# Altium footprint library 3D_MIG_Controller.PCBLIB: 560 footprints (part 5 of 35)
Each footprint in its own frame and in the unit in brackets; x right, y up, seen from the top. Pads: shape width x height; smd on the part's side, far side on the other; paste and mask are expansions set on the pad; w line width, h text height; cw(c..) or ccw(c..) is an arc to the next point about the centre after c.
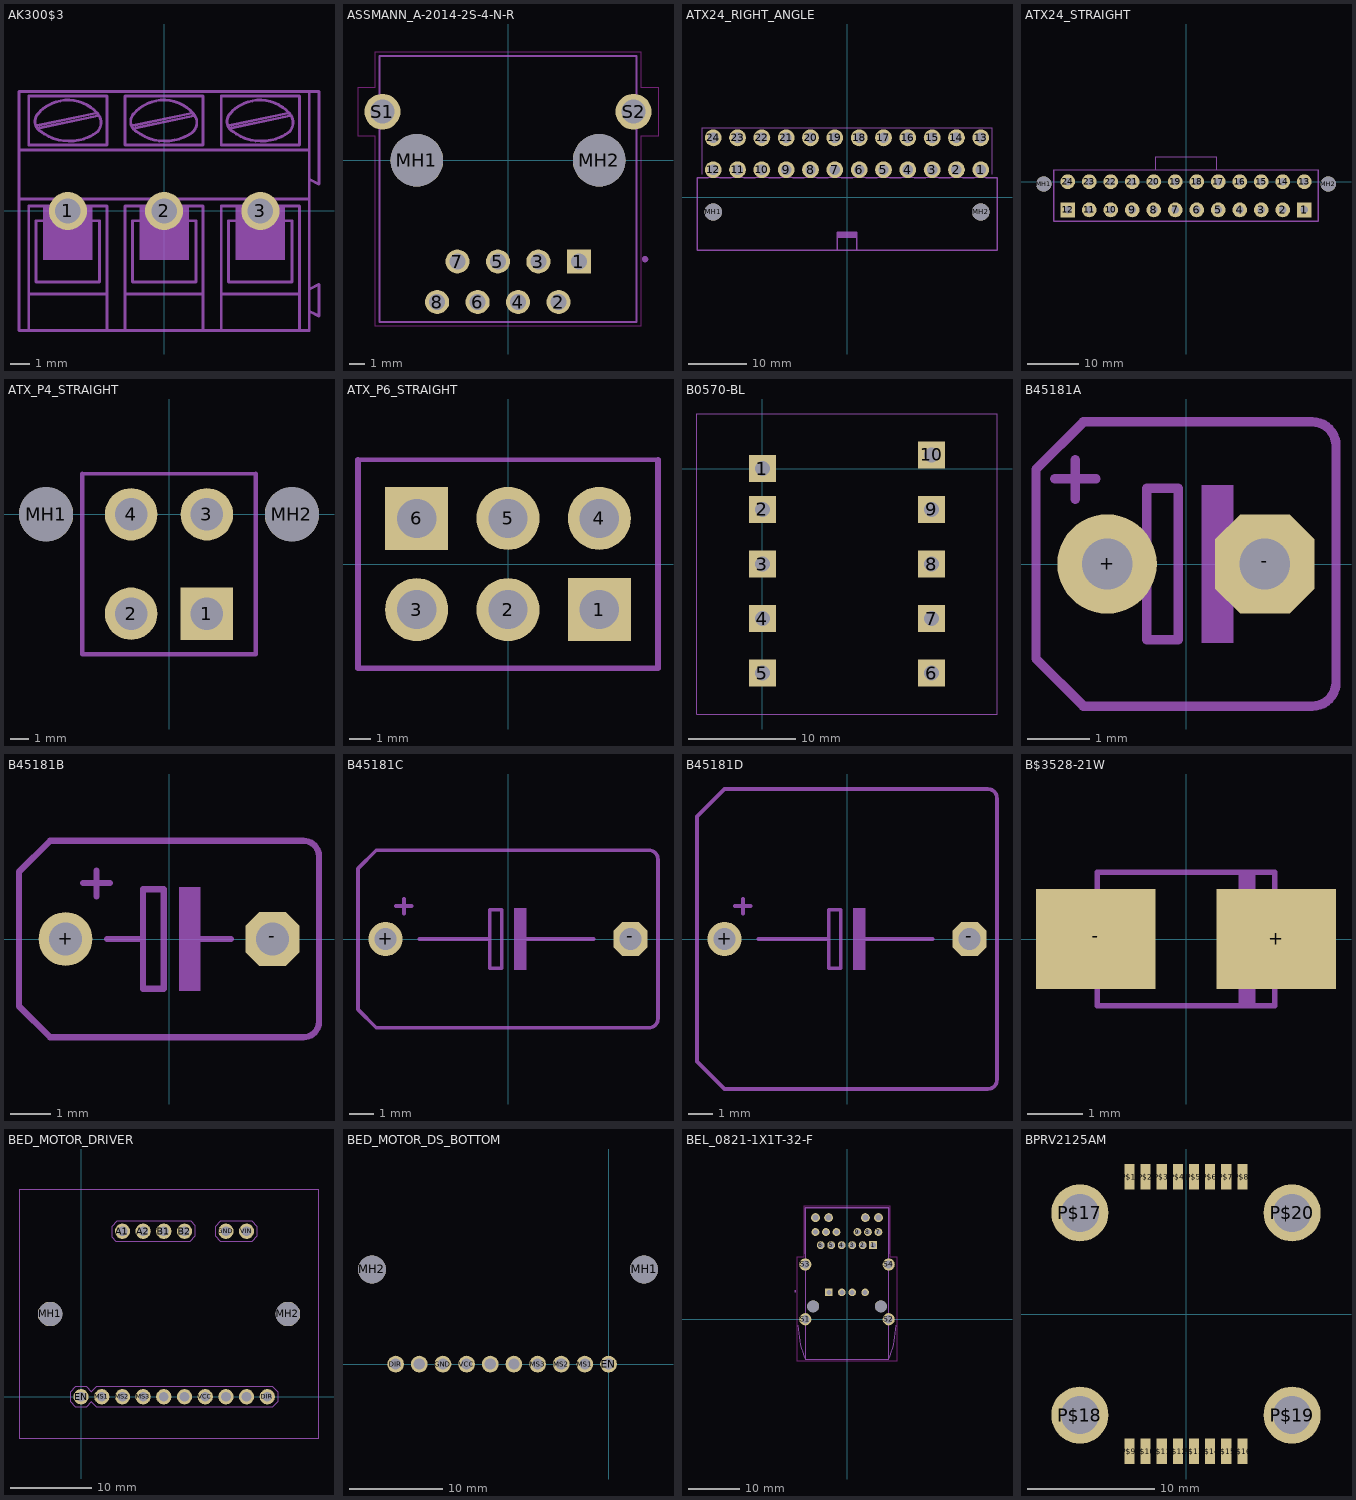
[diagram p4: the footprints below, top view; thin cyan lines are the x and y axes]

## AK300$3 [mil]
pads (3):
  round 78 hole 52: 1(-197,0) 2(0,0) 3(197,0)
tDocu:
  region: -247,-100 -247,10 -147,10 -147,-100
  region: -50,-100 -50,10 50,10 50,-100
  region: 147,-100 147,10 247,10 247,-100
  lines w6: -262,-20 -247,-20 ; -262,10 -132,10 ; -262,25 -132,25 ; -147,-20 -132,-20 ; -65,-20 -50,-20 ; -65,10 65,10 ; -65,25 65,25 ; 50,-20 65,-20 ; 132,-20 146,-20 ; 133,10 262,10 ; 133,25 262,25 ; 247,-20 262,-20
tPlace:
  lines w6: -262,-20 -262,-145 -132,-145 -132,-20 ; -262,10 -277,10 -277,-170 ; -262,25 -297,25 ; -260,175 -140,200 ; -260,197 cw(c-196.99,146) -135.81,199.17 ; -258,199 ccw(c-241,183) -252.34,162.59 ; -255,170 -135,195 ; -254,164 ccw(c-194,239) -136.37,162.16 ; -138.2,160.82 ccw(c-156,181) -136,199 ; -132,10 -117,10 -117,-170 ; -132,25 -65,25 ; -65,-20 -65,-145 65,-145 65,-20 ; -65,10 -80,10 -80,-170 ; -64,175 56,200 ; -64,197 cw(c-0.99,146) 60.19,199.17 ; -62,199 ccw(c-45,183) -56.34,162.59 ; -59,170 61,195 ; -58,164 ccw(c2,239) 59.63,162.16 ; 57.8,160.82 ccw(c40,181) 60,199 ; 65,10 80,10 80,-170 ; 66,25 132,25 ; 132,-20 132,-145 262,-145 262,-20 ; 133,10 117,10 117,-170 ; 133,175 253,200 ; 133,197 cw(c196,146) 257.18,199.16 ; 135,199 ccw(c152,183) 140.66,162.59 ; 138,170 258,195 ; 139,164 ccw(c199,239) 256.63,162.16 ; 254.8,160.82 ccw(c237,181) 257,199 ; 262,10 277,10 277,-170 ; 262,25 297,25 ; -297,25 -297,-245 -277,-245 ; -297,25 -297,125 ; -297,125 297,125 ; -297,125 -297,245 297,245 ; -277,-245 -117,-245 ; -277,-245 -277,-170 ; -277,-170 -117,-170 ; -117,-245 -117,-170 ; -117,-245 -80,-245 ; -80,-245 -80,-170 ; -80,-245 80,-245 ; -80,-170 80,-170 ; 80,-245 117,-245 ; 80,-245 80,-170 ; 117,-245 117,-170 ; 117,-245 277,-245 ; 117,-170 277,-170 ; 277,-245 297,-245 297,-205 ; 277,-245 277,-170 ; 297,-205 317,-215 317,-150 297,-160 ; 297,-205 297,-160 ; 297,-160 297,25 ; 297,25 297,65 ; 297,65 317,55 317,245 297,245 ; 297,65 297,125 ; 297,125 297,245 ; -277,135 -117,135 -117,235 -277,235 -277,135 ; -80,135 -80,235 80,235 80,135 -80,135 ; 117,135 117,235 277,235 277,135 117,135
  text "1" at -275,50 h62
  text "2" at -75,50 h62
  text "3" at 125,50 h62

## ASSMANN_A-2014-2S-4-N-R [mm]
pads (12):
  rect 1.508x1.508 / inner round 1.393 / far side rect 1.508x1.508 hole 1: 1(4.445,-6.35)
  round 1.508 hole 1: 2(3.175,-8.89) 3(1.905,-6.35) 4(0.635,-8.89) 5(-0.635,-6.35) 6(-1.905,-8.89) 7(-3.175,-6.35) 8(-4.445,-8.89)
  round 3.3 hole 3.3 unplated: MH1(-5.715,0) MH2(5.715,0)
  round 2.25 hole 1.5: S1(-7.875,3.05) S2(7.875,3.05)
Top keep-out:
  lines w0.05: -9.41,1.52 -8.325,1.52 -8.325,-10.4 8.325,-10.4 8.325,1.52 9.41,1.52 9.41,4.58 8.325,4.58 8.325,6.8 -8.325,6.8 -8.325,4.58 -9.41,4.58 -9.41,1.52
tDocu:
  circle w0.2: c8.6,-6.2 r0.1
  lines w0.127: -8.075,-10.15 8.075,-10.15 8.075,6.55 -8.075,6.55 -8.075,-10.15
tPlace:
  circle w0.2: c8.6,-6.2 r0.1
  lines w0.127: -8.075,1.35 -8.075,-10.15 8.075,-10.15 8.075,1.35 ; -8.075,4.7 -8.075,6.55 8.075,6.55 8.075,4.7

## ATX24_RIGHT_ANGLE [mm]
pads (26):
  round 2.9 hole 1.8: 1(23.1,4.76) 2(18.9,4.76) 3(14.7,4.76) 4(10.5,4.76) 5(6.3,4.76) 6(2.1,4.76) 7(-2.1,4.76) 8(-6.3,4.76) 9(-10.5,4.76) 10(-14.7,4.76) 11(-18.9,4.76) 12(-23.1,4.76) 13(23.1,10.26) 14(18.9,10.26) 15(14.7,10.26) 16(10.5,10.26) 17(6.3,10.26) 18(2.1,10.26) 19(-2.1,10.26) 20(-6.3,10.26) 21(-10.5,10.26) 22(-14.7,10.26) 23(-18.9,10.26) 24(-23.1,10.26)
  round 3 hole 3 unplated: MH1(-23.1,-2.54) MH2(23.1,-2.54)
tDocu:
  lines w0.127: -25,4 -25,12 25,12 25,4
  lines w0.203: -25.9,3.4 25.9,3.4
tPlace:
  region: -1.7,-7 1.7,-7 1.7,-6 -1.7,-6
  lines w0.254: -24,3.4 -25.9,3.4 -25.9,-9.14 25.9,-9.14 25.9,3.4 24,3.4 ; -22,3.4 -20,3.4 ; -17.8,3.4 -15.8,3.4 ; -13.5,3.4 -11.5,3.4 ; -9.4,3.4 -7.4,3.4 ; -5.2,3.4 -3.2,3.4 ; -1.7,-9 -1.7,-6 1.7,-6 1.7,-9 ; -1,3.4 1,3.4 ; 3.2,3.4 5.2,3.4 ; 7.4,3.4 9.4,3.4 ; 11.6,3.4 13.6,3.4 ; 15.8,3.4 17.8,3.4 ; 20,3.4 22,3.4

## ATX24_STRAIGHT [mm]
pads (26):
  rect 2.9x2.9 / inner round 2.679 / far side rect 2.9x2.9 hole 1.5: 1(23.1,-5.5) 12(-23.1,-5.5)
  round 2.9 hole 1.5: 2(18.9,-5.5) 3(14.7,-5.5) 4(10.5,-5.5) 5(6.3,-5.5) 6(2.1,-5.5) 7(-2.1,-5.5) 8(-6.3,-5.5) 9(-10.5,-5.5) 10(-14.7,-5.5) 11(-18.9,-5.5) 13(23.1,0) 14(18.9,0) 15(14.7,0) 16(10.5,0) 17(6.3,0) 18(2.1,0) 19(-2.1,0) 20(-6.3,0) 21(-10.5,0) 22(-14.7,0) 23(-18.9,0) 24(-23.1,0)
  round 3 hole 3 unplated: MH1(-27.8,-0.46) MH2(27.8,-0.46)
tDocu:
  lines w0.203: -25.9,2.25 25.9,2.25
tPlace:
  lines w0.127: -5.95,2.25 -5.95,4.9 5.95,4.9 5.95,2.25
  lines w0.254: -25.8,2.25 -25.8,-7.75 25.8,-7.75 25.8,2.25

## ATX_P4_STRAIGHT [mm]
pads (6):
  rect 2.9x2.9 / inner round 2.679 / far side rect 2.9x2.9 hole 1.8: 1(2.1,-5.5)
  round 2.9 hole 1.8: 2(-2.1,-5.5) 3(2.1,0) 4(-2.1,0)
  round 3 hole 3 unplated: MH1(-6.8,0) MH2(6.8,0)
tDocu:
  lines w0.203: -4.8,2.25 4.8,2.25
tPlace:
  lines w0.254: -4.8,2.25 -4.8,-7.75 4.8,-7.75 4.8,2.25

## ATX_P6_STRAIGHT [mil]
pads (6):
  rect 114.17x114.17 / inner round 105.48 / far side rect 114.17x114.17 hole 70.87: 1(165.35,-82.68) 6(-165.35,82.68)
  round 114.17 hole 70.87: 2(0,-82.68) 3(-165.35,-82.68) 4(165.35,82.68) 5(0,82.68)
tDocu:
  lines w8: -271.65,188.98 271.65,188.98
tPlace:
  lines w10: -271.65,188.98 -271.65,-188.98 271.65,-188.98 271.65,188.98

## B0570-BL [mil]
pads (10):
  rect 100x100 / inner round 92.39 / far side rect 100x100 hole 53.94: 1(0,0) 2(0,-150) 3(0,-350) 4(0,-550) 5(0,-750) 6(620.08,-750) 7(620.08,-550) 8(620.08,-350) 9(620.08,-150) 10(620.08,50)
tPlace:
  lines w3.94: -240,-900 860,-900 860,200 -240,200 -240,-900

## B45181A [mil]
pads (2):
  round 63 hole 32: +(-50,0)
  oct 63x63 / inner round 58.2 / far side oct 63x63 hole 32: -(50,0)
tDocu:
  region: 10,-50 10,50 30,50 30,-50
  lines w6: -65,0 -25,0 ; 25,0 65,0 ; -25,0 -25,-48 -5,-48 -5,48 -25,48 -25,0
tPlace:
  lines w6: -83,54 -57,54 ; -70,41 -70,66 ; -95,-60 -65,-90 80,-90 ccw(c80,-75) 95,-75 95,75 ccw(c80,75) 80,90 -65,90 -95,60 -95,-60

## B45181B [mil]
pads (2):
  round 52 hole 32: +(-100,0)
  oct 52x52 / inner round 48.04 / far side oct 52x52 hole 32: -(100,0)
tPlace:
  region: 10,-50 10,50 30,50 30,-50
  lines w6: -83,54 -57,54 ; -70,41 -70,66 ; -60,0 -25,0 ; 25,0 60,0 ; -25,0 -25,-48 -5,-48 -5,48 -25,48 -25,0 ; -145,-65 -115,-95 130,-95 ccw(c130,-80) 145,-80 145,80 ccw(c130,80) 130,95 -115,95 -145,65 -145,-65

## B45181C [mil]
pads (2):
  round 56 hole 36: +(-200,0)
  oct 56x56 / inner round 51.74 / far side oct 56x56 hole 36: -(200,0)
tPlace:
  region: 10,-50 10,50 30,50 30,-50
  lines w6: -183,54 -157,54 ; -170,41 -170,66 ; -145,0 -30,0 ; 25,0 140,0 ; -30,0 -30,-48 -10,-48 -10,48 -30,48 -30,0 ; -245,-115 -215,-145 230,-145 ccw(c230,-130) 245,-130 245,130 ccw(c230,130) 230,145 -215,145 -245,115 -245,-115

## B45181D [mil]
pads (2):
  round 56 hole 36: +(-200,0)
  oct 56x56 / inner round 51.74 / far side oct 56x56 hole 36: -(200,0)
tPlace:
  region: 10,-50 10,50 30,50 30,-50
  lines w6: -183,54 -157,54 ; -170,41 -170,66 ; -145,0 -30,0 ; 25,0 140,0 ; -30,0 -30,-48 -10,-48 -10,48 -30,48 -30,0 ; -245,-200 -200,-245 230,-245 ccw(c230,-230) 245,-230 245,230 ccw(c230,230) 230,245 -200,245 -245,200 -245,-200

## B$3528-21W [mil]
pads (2):
  rect 84.65x70.87 smd: +(63.98,0) -(-63.98,0)
tDocu:
  region: -68.9,-23.62 -68.9,23.62 -63.98,23.62 -63.98,-23.62
  region: 63.98,-23.62 63.98,23.62 68.9,23.62 68.9,-23.62
  region: 37.4,-48.23 37.4,48.23 49.21,48.23 49.21,-48.23
  lines w4: -62.99,-47.24 62.99,-47.24 62.99,47.24 -62.99,47.24 -62.99,-47.24

## BED_MOTOR_DRIVER [mil]
pads (18):
  round 74 hole 47.24: A1(200,800) A2(300,800) B1(400,800) B2(500,800) DIR(900,0) EN(0,0) GND(700,800) GND0(700,0) MS1(100,0) MS2(200,0) MS3(300,0) RESET(400,0) SLEEP(500,0) STEP(800,0) VCC(600,0) VIN(800,800)
  round 118.11 hole 118.11 unplated: MH1(-150,400) MH2(1000,400)
tPlace:
  lines w5: -300,-200 -300,1000 1150,1000 1150,-200 -300,-200 ; -50,-25 -25,-50 25,-50 50,-25 75,-50 925,-50 950,-25 950,25 925,50 75,50 50,25 25,50 -25,50 -50,25 -50,-25 ; 150,770 150,825 175,850 530,850 550,830 550,775 525,750 170,750 150,770 ; 650,775 675,750 825,750 850,775 850,825 825,850 675,850 650,825 650,775

## BED_MOTOR_DS_BOTTOM [mm]
pads (12):
  round 1.8 hole 1.2: DIR(-22.86,0) EN(0,0) GND(-17.78,0) MS1(-2.54,0) MS2(-5.08,0) MS3(-7.62,0) RESET(-10.16,0) SLEEP(-12.7,0) STEP(-20.32,0) VCC(-15.24,0)
  round 3 hole 3 unplated: MH1(3.81,10.16) MH2(-25.4,10.16)

## BEL_0821-1X1T-32-F [mil]
pads (26):
  rect 60x60 / inner round 55.43 / far side rect 60x60 hole 40: 1(199.5,565)
  round 60 hole 40: 2(119.5,565) 3(39.5,565) 4(-40.5,565) 5(-120.5,565) 6(-200.5,565) 7(239.5,665) 8(159.5,665) 9(79.5,665) 10(-80.5,665) 11(-160.5,665) 12(-240.5,665)
  round 67.5 hole 45: 13(240,775) 14(140,775) 15(-140,775) 16(-240,775)
  round 91 hole 91 unplated: MH1(-258.5,99) MH2(258.5,99)
  round 93 hole 62: S1(-317.5,0) S2(317.5,0) S3(-317.5,418) S4(317.5,418)
  rect 58x58 / inner round 53.59 / far side rect 58x58 hole 38: U1(-138,205)
  round 58 hole 38: U2(-39.5,205) U3(39.5,205) U4(138,205)
Top keep-out:
  lines w1.97: -384.02,-314.84 384.02,-314.84 384.02,474.41 328.84,474.41 328.84,859.84 -328.84,859.84 -328.84,474.41 -384.02,474.41 -384.02,-314.84
tDocu:
  circle w7.87: c-394.38,212.6 r3.94
  lines w5: -374,-47.24 ccw(c384.41,-20.16) -319,-305 ; 374,-47.24 cw(c-384.41,-20.16) 319,-305 ; -319,-305 -319,850 319,850 319,-305 ; -319,-305 319,-305
tPlace:
  circle w7.87: c-394.38,212.6 r3.94
  lines w5: -319,-100 -319,-305 319,-305 319,-100 ; -319,500 -319,850 319,850 319,500

## BPRV2125AM [mm]
pads (20):
  rect 0.8x2 smd: P$1(-4.45,10.8) P$2(-3.18,10.8) P$3(-1.91,10.8) P$4(-0.64,10.8) P$5(0.63,10.8) P$6(1.9,10.8) P$7(3.17,10.8) P$8(4.44,10.8) P$9(-4.45,-10.8) P$10(-3.18,-10.8) P$11(-1.91,-10.8) P$12(-0.64,-10.8) P$13(0.63,-10.8) P$14(1.9,-10.8) P$15(3.17,-10.8) P$16(4.44,-10.8)
  round 4.5 hole 3: P$17(-8.35,7.955) P$18(-8.35,-7.955) P$19(8.35,-7.955) P$20(8.35,7.955)